# Altium footprint library Component.PcbLib: 57 footprints (part 2 of 4)
Each footprint in its own frame and in the unit in brackets; x right, y up, seen from the top. Pads: shape width x height; smd on the part's side, far side on the other; paste and mask are expansions set on the pad; w line width, h text height; cw(c..) or ccw(c..) is an arc to the next point about the centre after c.
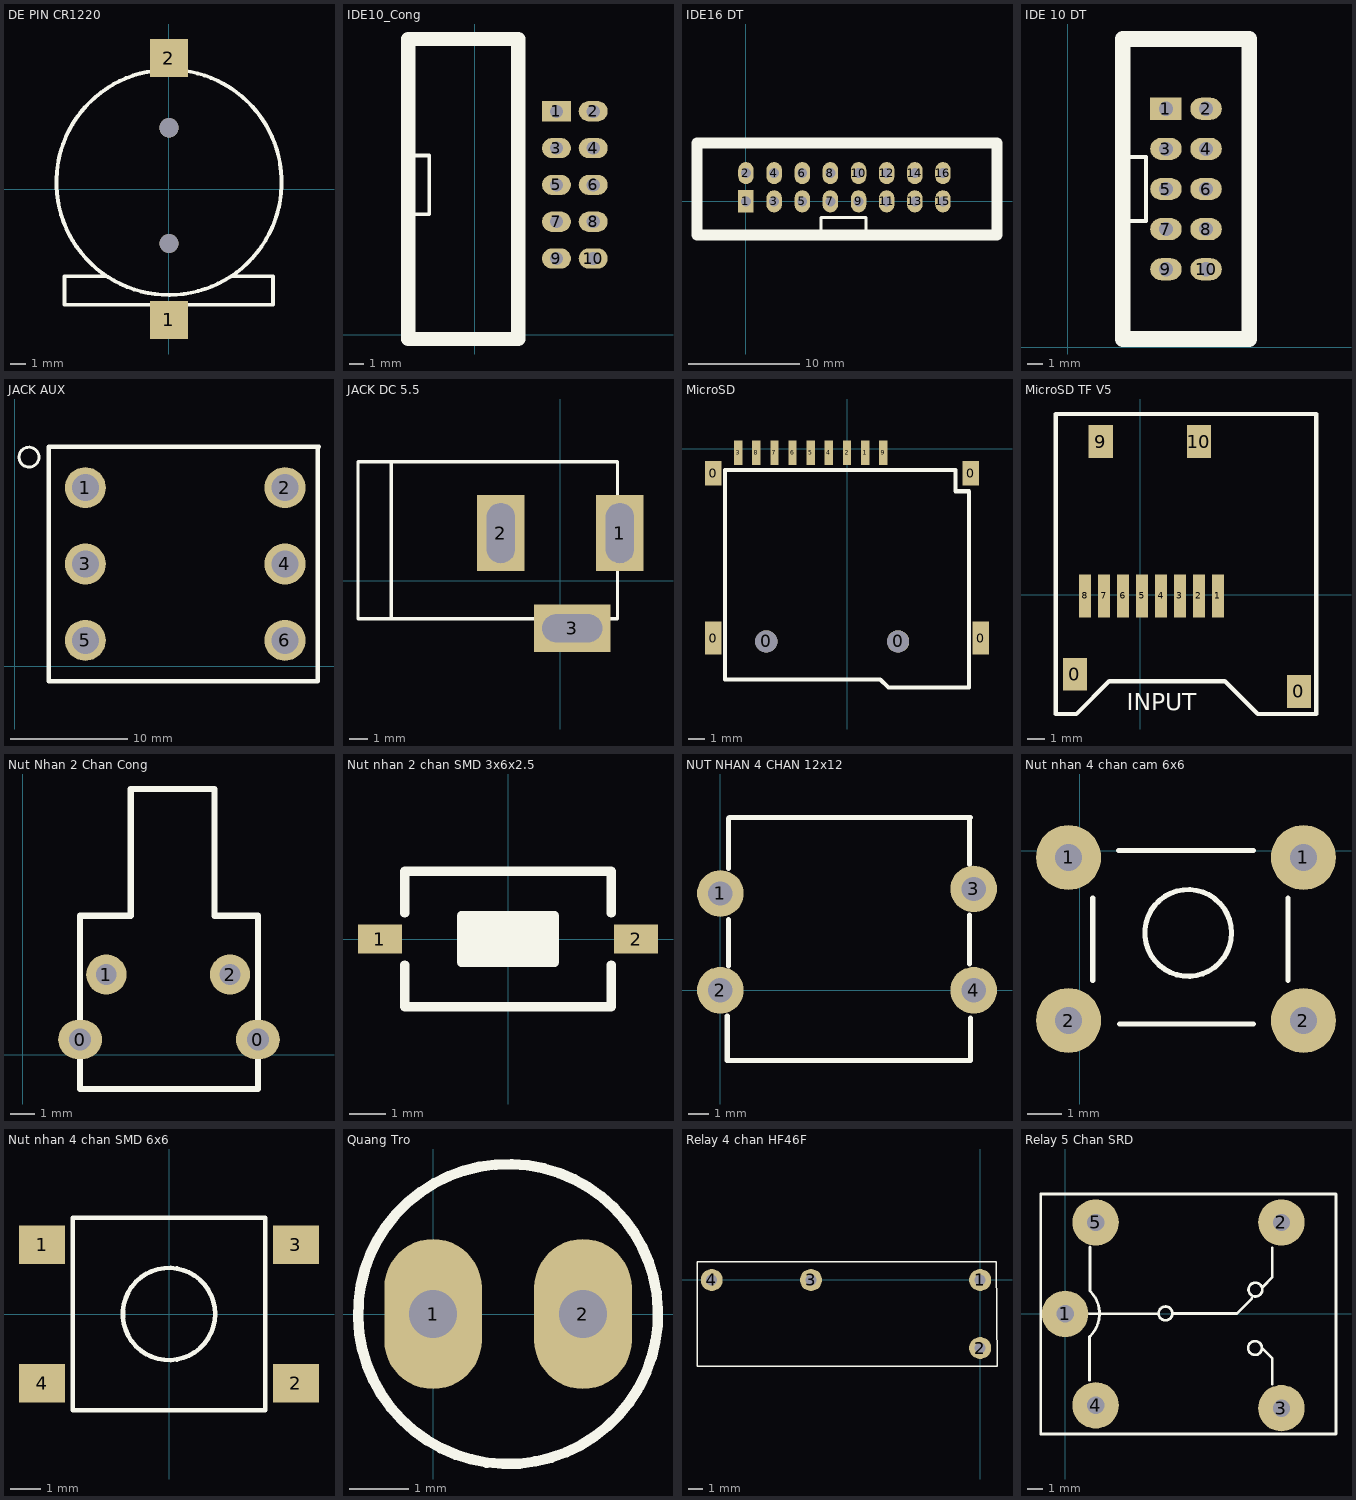
[diagram p1: the footprints below, top view; thin cyan lines are the x and y axes]

## DE PIN CR1220 [mm]
pads (2):
  rect 2.5x2.5 smd: 1(0,-8.6) 2(0,8.6)
via 0.005,-3.579 diameter 1.27 hole 1.27
via 0,4.026 diameter 1.27 hole 1.27
Top Overlay:
  lines w0.254: -4.194,-5.725 -6.868,-5.725 -6.868,-7.6 6.833,-7.6 6.833,-5.725 4.158,-5.725 ; -0.038,7.836 ccw(c0.005,0.439) 0,7.836
3D body "CR1220 SMD.STEP": height 4.27, standoff -0.48, extent -7.389,-9.42 7.36,9.38

## IDE10_Cong [mm]
pads (10):
  rect 2x1.4 hole 0.9: 1(5.623,15.413)
  oval 2x1.4 hole 0.9: 2(8.163,15.413) 3(5.623,12.873) 4(8.163,12.873) 5(5.623,10.333) 6(8.163,10.333) 7(5.623,7.793) 8(8.163,7.793) 9(5.623,5.253) 10(8.163,5.253)
Top Overlay:
  lines w0.254: -4.163,8.301 -3.147,8.301 -3.147,8.555 -3.147,12.365 -4.163,12.365
  lines w1: -4.6,-0.3 -4.6,20.4 3,20.4 3,-0.3 -4.6,-0.3
3D body "User Library-IDC Socket Male 10pin Angled THT Goldplated 2_54mm.STEP": height 8.98, standoff -2.37, extent -4.9,-0.47 8.66,20.47
3D body: height 53.34, standoff 0, extent 4.4,0.1 4.4,0.1

## IDE16 DT [mm]
pads (16):
  rect 1.4x2 hole 0.9: 1(0,0)
  oval 1.4x2 hole 0.9: 2(0,2.54) 3(2.54,0) 4(2.54,2.54) 5(5.08,0) 6(5.08,2.54) 7(7.62,0) 8(7.62,2.54) 9(10.16,0) 10(10.16,2.54) 11(12.7,0) 12(12.7,2.54) 13(15.24,0) 14(15.24,2.54) 15(17.78,0) 16(17.78,2.54)
Top Overlay:
  lines w0.254: 6.782,-2.718 6.782,-1.448 10.846,-1.448 10.846,-2.972
  lines w1: 8.28,-3.048 22.657,-3.048 22.657,5.27 8.28,5.27 ; 14.58,-3.048 -4.42,-3.048 -4.42,5.27 14.58,5.27

## IDE 10 DT [mm] "Connector; Header; 5x2 Position"
pads (10):
  rect 2x1.4 hole 0.9: 1(6.223,15.113)
  oval 2x1.4 hole 0.9: 2(8.763,15.113) 3(6.223,12.573) 4(8.763,12.573) 5(6.223,10.033) 6(8.763,10.033) 7(6.223,7.493) 8(8.763,7.493) 9(6.223,4.953) 10(8.763,4.953)
Top Overlay:
  lines w0.254: 3.937,8.001 4.953,8.001 4.953,8.255 4.953,12.065 3.937,12.065
  lines w1: 3.493,0.533 11.493,0.533 11.493,19.533 3.493,19.533 3.493,0.533
3D body "User Library-Tyco - 5103308-1 (Shrouded Header 2_54mm 10 Pin).step": height 9.86, standoff -3.05, extent 2.921,-0.508 12.065,19.812

## JACK AUX [mm]
pads (6):
  round 3.5 hole 2.3: 1(6,15.2) 2(23,15.2) 3(6,8.7) 4(23,8.7) 5(6,2.2) 6(23,2.2)
Top Overlay:
  circle w0.254: c1.2,17.8 r0.849
  lines w0.381: 2.9,-1.3 25.8,-1.3 25.8,18.6 25.9,18.7 2.9,18.7 2.9,-1.3

## JACK DC 5.5 [mm] "Jac DC input"
height 5.08
pads (3):
  rect 2.54x4.064 hole 1.5 slot 3.2 at 90 deg: 1(3.175,2.54) 2(-3.175,2.54)
  rect 4.064x2.54 hole 1.5 slot 3.2 at 0 deg: 3(0.635,-2.54)
Top Overlay:
  lines w0.178: -9.017,-2.032 -9.017,6.35 ; -10.795,-2.032 -10.795,6.35 3.048,6.35 3.048,-2.032 -10.795,-2.032
3D body "SW3dPS-dc range - dc connector[4840.2201].STEP": height 11.02, standoff -3.48, extent -10.423,-2.67 3.404,6.836

## MicroSD [mm]
pads (15):
  rect 1x2 smd: 0(-8.1,-11.5) 0(8.1,-11.5)
  rect 1x1.5 smd: 0(-8.1,-1.5) 0(7.5,-1.5)
  round 1.35 hole 1.35: 0(-4.9,-11.7) 0(3.1,-11.7)
  rect 0.5x1.5 smd: 1(1.1,-0.254) 2(0,-0.254) 3(-6.6,-0.254) 4(-1.1,-0.254) 5(-2.2,-0.254) 6(-3.3,-0.254) 7(-4.4,-0.254) 8(-5.5,-0.254) 9(2.2,-0.254)
Top Overlay:
  lines w0.254: -7.4,-14 -7.4,-1.295 6.579,-1.295 6.579,-2.591 7.4,-2.591 7.4,-14.5 2.515,-14.5 2.015,-14 0,-14 -7.4,-14
3D body "User Library-Socket-MicroSD-Type1-with-SDCard.STEP": height 1.91, standoff -0.43, extent -6.95,-19.6 7.15,0.5

## MicroSD TF V5 [mm]
pads (12):
  rect 1.4x1.9 smd: 0(-3.8,-4.6) 0(9.2,-5.6) 9(-2.3,8.9) 10(3.4,8.9)
  rect 0.7x2.5 smd: 1(4.5,-0.054) 2(3.4,-0.054) 3(2.3,-0.054) 4(1.2,-0.054) 5(0.1,-0.054) 6(-1,-0.054) 7(-2.1,-0.054) 8(-3.2,-0.054)
Top Overlay:
  lines w0.254: -4.9,-6.909 -4.9,10.5 -1.4,10.5 6.4,10.5 10.2,10.5 10.2,-6.909 6.809,-6.909 4.9,-5 -1.8,-5 -3.709,-6.909 -3.979,-6.909 -4.9,-6.909
  text "INPUT" at -0.8,-6.7 h1
3D body "User Library-473521001_microSD.STEP": height 2, standoff 0.12, extent -4.35,-5.54 9.75,9.66

## Nut Nhan 2 Chan Cong [mm]
pads (4):
  oval 1.8x1.6 hole 0.9: 0(2.352,0.635) 0(9.652,0.635)
  round 1.65 hole 0.85: 1(3.429,3.302) 2(8.509,3.302)
Top Overlay:
  lines w0.254: 2.352,-1.397 2.352,5.715 4.43,5.715 4.43,10.922 7.874,10.922 7.874,5.715 9.652,5.715 9.652,-1.397 2.352,-1.397

## Nut nhan 2 chan SMD 3x6x2.5 [mm] "Switch SMD type"
pads (2):
  rect 1.2x0.8 smd: 1(-3.5,0) 2(3.5,0)
Top Overlay:
  rectangle: -1.27,-0.635 1.27,0.635
  lines w0.254: -2.819,-0.711 -2.819,-1.854 2.819,-1.854 2.819,-0.711 ; -2.819,0.711 -2.819,1.854 2.819,1.854 2.819,0.711 ; -1.27,-0.635 -1.27,0.635 1.27,0.635 1.27,-0.635 -1.27,-0.635
3D body "User Library-Button-SMD.step": height 2.5, standoff 0, extent -3.05,-1.85 3.05,1.85

## NUT NHAN 4 CHAN 12x12 [mm]
pads (4):
  round 2.3 hole 1.2: 1(0,4.775) 2(0,0) 3(12.5,5) 4(12.5,0)
Top Overlay:
  lines w0.254: 0.34,-1.26 0.34,-3.47 12.34,-3.47 12.34,-1.36 ; 0.4,1.2 0.4,3.5 ; 0.4,6 0.4,8.47 0.46,8.53 12.34,8.53 ; 12.3,1.3 12.3,3.7 ; 12.3,6.2 12.3,8.49

## Nut nhan 4 chan cam 6x6 [mil] "SW button 4pin, 250 x250 mil"
height 100
pads (4):
  round 75 hole 31: 1(-13,-8) 1(258,-8) 2(-13,-196) 2(258,-196)
Top Overlay:
  circle w6: c125,-95 r50
  lines w6: 15,-150 15,-55 ; 45,0 200,0 ; 46,-200 200,-200 ; 240,-150 240,-55
  lines w7: 239,-215 240,-214
3D body "SW3dPS-.STEP": height 275.59, standoff -137.8, extent -30.51,-225 280.51,19.09

## Nut nhan 4 chan SMD 6x6 [mil] "SW SMD button 4pin, 250 x250 mil"
height 100
pads (4):
  rect 60x50 smd: 1(-165,90) 2(165,-90) 3(165,90) 4(-165,-90)
Top Overlay:
  circle w6: c0,0 r60
  lines w6: -125,-125 -125,125 125,125 125,-125 -125,-125
3D body: height 130, standoff 80, extent -59.76,-59.88 59.76,59.88
3D body: height 80, standoff 10, extent -125,-125 125,125
3D body: height 20, standoff 0, extent 125,-105 180,-75
3D body: height 20, standoff 0, extent 125,75 180,105
3D body: height 20, standoff 0, extent -180,75 -125,105
3D body: height 20, standoff 0, extent -180,-105 -125,-75

## Quang Tro [mil] "QUANG TRO"
height 300
pads (2):
  oval 65x100 hole 32: 1(0,0) 2(100,0)
Top Overlay:
  lines w7: 136.62,-49.97 cw(c50,0) 137.42,-48.56

## Relay 4 chan HF46F [mil]
pads (4):
  round 60 hole 30: 1(0,0) 2(0,-185.04) 3(-460,0) 4(-730,0)
Top Overlay:
  lines w3.94: -770,-235 45.78,-235 44.39,50 -770,50 -770,-235
3D body "User Library-Relay-HF46F-G 5-HS1.STEP": height 154.48, standoff -582.23, extent -763.15,-227.99 40,47.99

## Relay 5 Chan SRD [mil] "Relay SPDT, 5 pin, 10A,W 650mil, L 800mil, H 800mil"
height 800
pads (5):
  round 120 hole 45: 1(0,0) 2(559.06,236.22) 3(559.06,-243.78) 4(78.74,-236.22) 5(78.74,236.22)
Top Overlay:
  circle w7: c491.79,62.82 r17.8
  circle w7: c490.79,-88.18 r17.8
  circle w7: c259.42,1.12 r17.8
  lines w7: 34.97,0.12 239.22,0.12 ; 63.22,-171.88 63.22,-58.88 ; 64.22,-57.88 ccw(c6.72,0.62) 65.22,58.12 ; 64.22,59.12 64.22,173.12 ; 279.22,1.12 443.6,1.12 ; 443.6,1.02 482.6,40.02 ; 508.6,-88.18 535.6,-115.18 535.6,-181.18 ; 509.6,68.82 535.6,94.82 535.6,170.82 ; -63.4,-310.6 700,-310.6 700,310 -63.4,310 -63.4,-310.6
  lines w10: 553.61,232.5 557.91,236.8
3D body "User Library-SONGLE Relay SRU-12VDC-SL-C.STEP": height 602.36, standoff -196.85, extent -55.1,-305.92 696.87,304.32